# Altium footprint library Toroidal.PcbLib: 14 footprints
Each footprint in its own frame and in the unit in brackets; x right, y up, seen from the top. Pads: shape width x height; smd on the part's side, far side on the other; paste and mask are expansions set on the pad; w line width, h text height; cw(c..) or ccw(c..) is an arc to the next point about the centre after c.
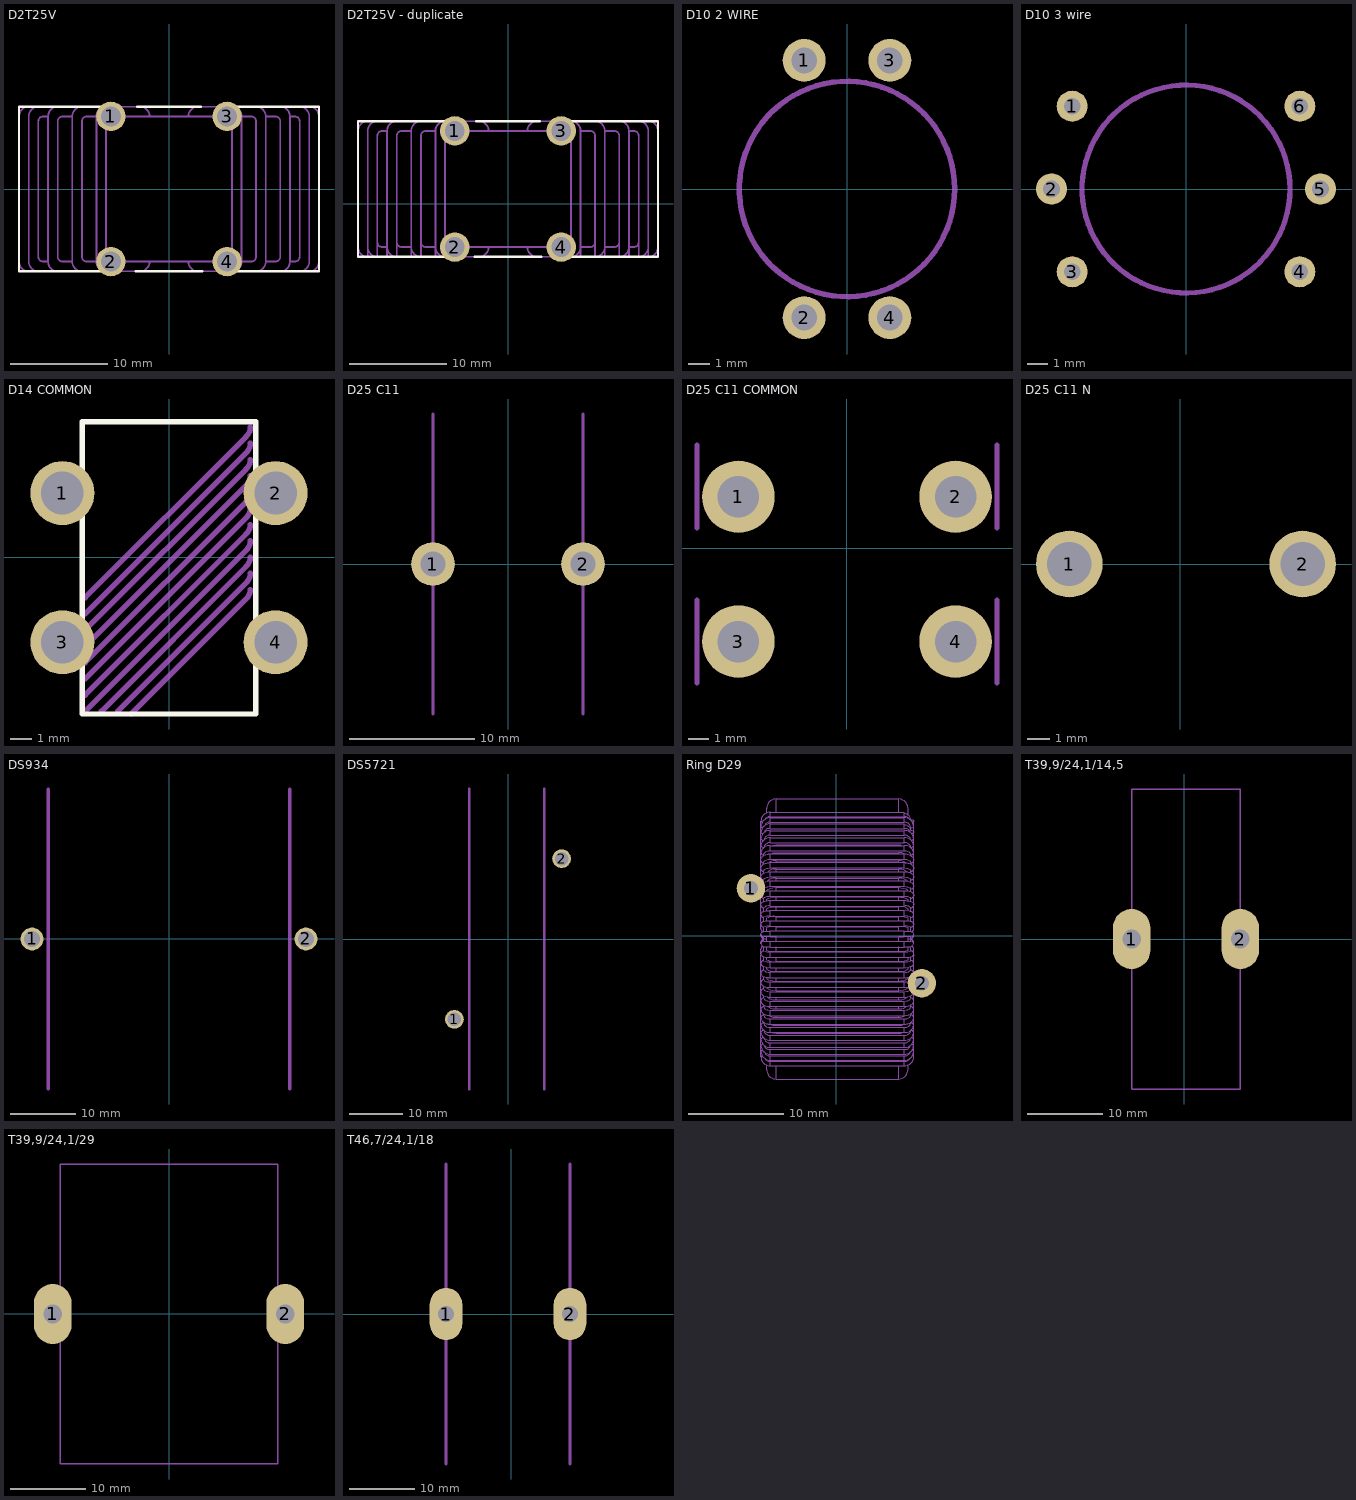
[diagram p0: the footprints below, top view; thin cyan lines are the x and y axes]

## D2T25V [mil]
pads (4):
  round 120 hole 80: 1(-236.22,295.28) 2(-236.22,-295.28) 3(236.22,295.28) 4(236.22,-295.28)
Top Overlay:
  lines w10: -259.84,-334.65 -610.24,-334.65 -610.24,334.65 -259.84,334.65 ; -135,-334.65 135,-334.65 ; -130,334.65 130,334.65 ; 259.84,-334.65 610.24,-334.65 610.24,334.65 259.84,334.65
Mechanical 3:
  text ".Designator / .Comment" at -85,-30 h40
Mechanical 13:
  lines w7.01: -590.55,-334.65 -118.11,-334.65 ccw(c-118.11,-295.28) -78.74,-295.28 ; -590.55,334.65 -118.11,334.65 cw(c-118.11,295.28) -78.74,295.28 ; -570.87,-334.65 cw(c-570.87,-295.28) -610.24,-295.28 -610.24,295.28 cw(c-570.87,295.28) -570.87,334.65 ; -531.5,-334.65 cw(c-531.5,-295.28) -570.87,-295.28 -570.87,295.28 cw(c-531.5,295.28) -531.5,334.65 ; -531.5,-279.53 -531.5,275.59 cw(c-511.81,275.59) -511.81,295.28 -492.13,295.28 ; -531.5,-275.59 ccw(c-511.81,-275.59) -511.81,-295.28 -492.13,-295.28 ; -452.76,-334.65 cw(c-452.76,-295.28) -492.13,-295.28 ; -452.76,334.65 ccw(c-452.76,295.28) -492.13,295.28 ; -354.33,-334.65 cw(c-354.33,-295.28) -393.7,-295.28 ; -354.33,275.59 cw(c-334.65,275.59) -334.65,295.28 -295.28,295.28 ; -354.33,279.53 -354.33,-275.59 ccw(c-334.65,-275.59) -334.65,-295.28 -295.28,-295.28 ; -354.33,334.65 ccw(c-354.33,295.28) -393.7,295.28 ; -255.91,-334.65 cw(c-255.91,-295.28) -295.28,-295.28 ; -255.91,334.65 ccw(c-255.91,295.28) -295.28,295.28 ; 78.74,-295.28 ccw(c118.11,-295.28) 118.11,-334.65 590.55,-334.65 ; 78.74,295.28 cw(c118.11,295.28) 118.11,334.65 590.55,334.65 ; 255.91,-334.65 ccw(c255.91,-295.28) 295.28,-295.28 ; 255.91,334.65 cw(c255.91,295.28) 295.28,295.28 ; 354.33,-334.65 ccw(c354.33,-295.28) 393.7,-295.28 ; 354.33,275.59 ccw(c334.65,275.59) 334.65,295.28 295.28,295.28 ; 354.33,279.53 354.33,-275.59 cw(c334.65,-275.59) 334.65,-295.28 295.28,-295.28 ; 354.33,334.65 cw(c354.33,295.28) 393.7,295.28 ; 452.76,-334.65 ccw(c452.76,-295.28) 492.13,-295.28 ; 452.76,334.65 cw(c452.76,295.28) 492.13,295.28 ; 531.5,-334.65 ccw(c531.5,-295.28) 570.87,-295.28 570.87,295.28 ccw(c531.5,295.28) 531.5,334.65 ; 531.5,-279.53 531.5,275.59 ccw(c511.81,275.59) 511.81,295.28 492.13,295.28 ; 531.5,-275.59 cw(c511.81,-275.59) 511.81,-295.28 492.13,-295.28 ; 570.87,-334.65 ccw(c570.87,-295.28) 610.24,-295.28 610.24,295.28 ccw(c570.87,295.28) 570.87,334.65 ; -492.13,-295.28 -492.13,295.28 ; -393.7,-295.28 -433.07,-295.28 cw(c-433.07,-275.59) -452.76,-275.59 -452.76,275.59 cw(c-433.07,275.59) -433.07,295.28 -393.7,295.28 ; -393.7,-295.28 -393.7,295.28 ; -295.28,-295.28 -295.28,295.28 ; 295.28,-295.28 295.28,295.28 ; 393.7,-295.28 393.7,295.28 ; 393.7,-295.28 433.07,-295.28 ccw(c433.07,-275.59) 452.76,-275.59 452.76,275.59 ccw(c433.07,275.59) 433.07,295.28 393.7,295.28 ; 492.13,-295.28 492.13,295.28 ; -255.91,-275.59 ccw(c-236.22,-275.59) -236.22,-295.28 236.22,-295.28 ccw(c236.22,-275.59) 255.91,-275.59 255.91,275.59 ccw(c236.22,275.59) 236.22,295.28 -236.22,295.28 ccw(c-236.22,275.59) -255.91,275.59 -255.91,-275.59
3D body "User Library-SCF20.step": height 1111.4, standoff -687.01, extent -530.84,-305.12 510.84,305.12

## D2T25V - duplicate [mil]
pads (4):
  round 120 hole 80: 1(-216.54,295.28) 2(-216.54,-177.17) 3(216.54,295.28) 4(216.54,-177.17)
Top Overlay:
  lines w10: -259.84,-216.54 -610.24,-216.54 -610.24,334.65 -259.84,334.65 ; -135,-216.54 135,-216.54 ; -130,334.65 130,334.65 ; 259.84,-216.54 610.24,-216.54 610.24,334.65 259.84,334.65
Mechanical 3:
  text ".Designator / .Comment" at -85,-30 h40
Mechanical 13:
  lines w7.01: -610.24,-216.54 -610.24,295.28 cw(c-570.87,295.28) -570.87,334.65 ; -610.24,-177.17 ccw(c-570.87,-177.17) -570.87,-216.54 -570.87,295.28 cw(c-531.5,295.28) -531.5,334.65 ; -590.55,-216.54 -118.11,-216.54 ccw(c-118.11,-177.17) -78.74,-177.17 ; -590.55,334.65 -118.11,334.65 cw(c-118.11,295.28) -78.74,295.28 ; -570.87,-177.17 ccw(c-531.5,-177.17) -531.5,-216.54 -531.5,275.59 cw(c-511.81,275.59) -511.81,295.28 -492.13,295.28 ; -531.5,-157.48 ccw(c-511.81,-157.48) -511.81,-177.17 -492.13,-177.17 ccw(c-452.76,-177.17) -452.76,-216.54 -452.76,275.59 cw(c-433.07,275.59) -433.07,295.28 -393.7,295.28 ; -492.13,-216.54 -492.13,295.28 ; -452.76,-157.48 ccw(c-433.07,-157.48) -433.07,-177.17 -393.7,-177.17 ccw(c-354.33,-177.17) -354.33,-216.54 -354.33,279.53 ; -452.76,334.65 ccw(c-452.76,295.28) -492.13,295.28 ; -393.7,-216.54 -393.7,295.28 ; -354.33,-157.48 ccw(c-334.65,-157.48) -334.65,-177.17 -295.28,-177.17 ccw(c-255.91,-177.17) -255.91,-216.54 -255.91,275.59 cw(c-236.22,275.59) -236.22,295.28 236.22,295.28 cw(c236.22,275.59) 255.91,275.59 255.91,-216.54 ccw(c255.91,-177.17) 295.28,-177.17 334.65,-177.17 ccw(c334.65,-157.48) 354.33,-157.48 ; -354.33,275.59 cw(c-334.65,275.59) -334.65,295.28 -295.28,295.28 ; -354.33,334.65 ccw(c-354.33,295.28) -393.7,295.28 ; -295.28,-216.54 -295.28,295.28 ; -255.91,-157.48 ccw(c-236.22,-157.48) -236.22,-177.17 236.22,-177.17 ccw(c236.22,-157.48) 255.91,-157.48 ; -255.91,334.65 ccw(c-255.91,295.28) -295.28,295.28 ; 78.74,-177.17 ccw(c118.11,-177.17) 118.11,-216.54 590.55,-216.54 ; 78.74,295.28 cw(c118.11,295.28) 118.11,334.65 590.55,334.65 ; 255.91,334.65 cw(c255.91,295.28) 295.28,295.28 ; 295.28,-216.54 295.28,295.28 ; 354.33,275.59 ccw(c334.65,275.59) 334.65,295.28 295.28,295.28 ; 354.33,279.53 354.33,-216.54 ccw(c354.33,-177.17) 393.7,-177.17 433.07,-177.17 ccw(c433.07,-157.48) 452.76,-157.48 ; 354.33,334.65 cw(c354.33,295.28) 393.7,295.28 ; 393.7,-216.54 393.7,295.28 ; 452.76,334.65 cw(c452.76,295.28) 492.13,295.28 ; 492.13,-216.54 492.13,295.28 ; 531.5,-157.48 cw(c511.81,-157.48) 511.81,-177.17 492.13,-177.17 cw(c452.76,-177.17) 452.76,-216.54 452.76,275.59 ccw(c433.07,275.59) 433.07,295.28 393.7,295.28 ; 531.5,334.65 cw(c531.5,295.28) 570.87,295.28 570.87,-216.54 ccw(c570.87,-177.17) 610.24,-177.17 ; 570.87,-177.17 cw(c531.5,-177.17) 531.5,-216.54 531.5,275.59 ccw(c511.81,275.59) 511.81,295.28 492.13,295.28 ; 570.87,334.65 cw(c570.87,295.28) 610.24,295.28 610.24,-196.85
3D body "44057.stp": height 1122.05, standoff 19.68, extent -551.17,-196.84 551.19,314.97

## D10 2 WIRE [mm]
pads (4):
  round 2 hole 1.2: 1(-2,6) 2(-2,-6) 3(2,6) 4(2,-6)
Mechanical 13:
  circle w0.254: c0,0 r5.025
3D body: height 4, standoff 0.5, extent 0,0 5.025,5
3D body: height 4, standoff 0.5, extent -5.025,0 0,5
3D body: height 4, standoff 0.5, extent 0,-5 5.025,0
3D body: height 4, standoff 0.5, extent -5.025,-5 0,0

## D10 3 wire [mm]
pads (6):
  round 1.5 hole 0.8: 1(-5.5,4) 2(-6.5,0) 3(-5.5,-4) 4(5.5,-4) 5(6.5,0) 6(5.5,4)
Mechanical 13:
  circle w0.254: c0,0 r5.025
3D body: height 4, standoff 0.5, extent -5.025,-5 0,0
3D body: height 4, standoff 0.5, extent 0,-5 5.025,0
3D body: height 4, standoff 0.5, extent -5.025,0 0,5
3D body: height 4, standoff 0.5, extent 0,0 5.025,5

## D14 COMMON [mm]
pads (4):
  round 3 hole 2: 1(-5,3) 2(5,3) 3(-5,-4) 4(5,-4)
Top Overlay:
  lines w0.254: -4.064,-7.366 4.064,-7.366 4.064,6.35 -4.064,6.35 -4.064,-7.366
Mechanical 1:
  lines w0.254: -3.937,-7.239 3.63,0.328 ccw(c3.197,0.762) 3.81,0.762 ; -3.937,-6.477 3.63,1.09 ccw(c3.197,1.524) 3.81,1.524 ; -3.937,-5.715 3.63,1.852 ccw(c3.197,2.286) 3.81,2.286 ; -3.937,-4.953 3.63,2.614 ccw(c3.197,3.048) 3.81,3.048 ; -3.937,-4.191 3.63,3.376 ccw(c3.197,3.81) 3.81,3.81 ; -3.937,-3.429 3.63,4.138 ccw(c3.197,4.572) 3.81,4.572 ; -3.937,-2.667 3.63,4.9 ccw(c3.197,5.334) 3.81,5.334 ; -3.937,-1.905 3.63,5.662 ccw(c3.197,6.096) 3.81,6.096 ; -3.175,-7.239 3.63,-0.434 ccw(c3.197,0) 3.81,0 ; -2.413,-7.239 3.63,-1.196 ccw(c3.197,-0.762) 3.81,-0.762 ; -1.778,-7.366 3.63,-1.958 ccw(c3.197,-1.524) 3.81,-1.524
3D body "User Library-coil_14x8.step": height 13.64, standoff -3.06, extent -4.635,-7.218 4.863,6.456

## D25 C11 [mm]
pads (2):
  round 3.5 hole 2: 1(-6,0) 2(6,0)
Mechanical 3:
  text ".Designator / .Comment" at -2.2,-0.7 h1
Mechanical 13:
  circle w0.254: c6,0 r1
  circle w0.254: c-6,0 r1
  lines w0.254: -6,-12 -6,-1 ; -6,1 -6,12 ; 6,-12 6,-1 ; 6,1 6,12
3D body "2101-v-rc.stp": height 27.45, standoff -6.15, extent -4.982,-10.452 5,10.452

## D25 C11 COMMON [mm]
pads (4):
  round 3.5 hole 2: 1(-5.25,2.5) 2(5.25,2.5) 3(-5.25,-4.5) 4(5.25,-4.5)
Mechanical 3:
  text ".Designator / .Comment" at -2.2,-0.7 h1
Mechanical 13:
  circle w0.254: c-5.25,-4.5 r1
  circle w0.254: c5.25,-4.5 r1
  circle w0.254: c5.25,2.5 r1
  circle w0.254: c-5.25,2.5 r1
  lines w0.254: -7.25,-6.5 -7.25,-2.5 ; -7.25,1 -7.25,5 ; 7.25,-6.5 7.25,-2.5 ; 7.25,1 7.25,5

## D25 C11 N [mm]
pads (2):
  round 3 hole 2: 1(-5,0) 2(5.5,0)
Mechanical 3:
  text ".Designator / .Comment" at -2.2,-0.7 h1
Mechanical 13:
  circle w0.254: c5.5,0 r1
  circle w0.254: c-5,0 r1

## DS934 [mm]
pads (2):
  round 3.5 hole 2.5: 1(-21,0) 2(21,0)
Mechanical 13:
  lines w0.5: -18.5,-23 -18.5,0 -18.5,23 ; 18.5,-23 18.5,0 18.5,23
3D body: height 46.5, standoff 23.5, extent -18,-23 0,0
3D body: height 46.5, standoff 23.5, extent -18,0 0,23
3D body: height 23.5, standoff 0.5, extent -18,0 0,23
3D body: height 23.5, standoff 0.5, extent -18,-23 0,0
3D body: height 23.5, standoff 0.5, extent 0,-23 18,0
3D body: height 23.5, standoff 0.5, extent 0,0 18,23
3D body: height 46.5, standoff 23.5, extent 0,0 18,23
3D body: height 46.5, standoff 23.5, extent 0,-23 18,0

## DS5721 [mm]
pads (2):
  round 3.5 hole 2.5: 1(-10,-15) 2(10,15)
Mechanical 13:
  lines w0.5: -7.25,-28 -7.25,28 ; 6.75,-28 6.75,0 6.75,28
3D body: height 58.5, standoff 29.5, extent -7.25,-29 6.75,0
3D body: height 29.5, standoff 0.5, extent -7.25,-29 6.75,0
3D body: height 29.5, standoff 0.5, extent -7.25,0 6.75,29
3D body: height 58.5, standoff 29.5, extent -7.25,0 6.75,29

## Ring D29 [mm]
pads (2):
  round 3 hole 1.5 unplated paste-25.4: 1(-9,5) 2(9,-5)
Mechanical 13:
  drawing of 1131 lines, arcs and shapes, not listed
3D body "User Library-D29_2x30.step": height 30.75, standoff 1.25, extent -8.1,-15.34 8,15.34

## T39,9/24,1/14,5 [mm]
pads (2):
  oval 5x8 hole 2.5 square: 1(-7,0) 2(7.5,0)
Mechanical 13:
  lines w0.2: -7,-20.001 7.5,-20.001 7.5,20.002 ; -7,-20 -7,20.002 ; -7,20.001 ccw(c-7,20.002) -7,20.002 ; -7,20.002 7.5,20.002 ; 7.5,20.002 ccw(c7.5,20.002) 7.5,20.001 ; 7.5,20.001 7.5,20.002
3D body: height 20, standoff -20, extent -7,-20.001 7.5,20.002

## T39,9/24,1/29 [mm]
pads (2):
  oval 5x8 hole 2.5 square: 1(-15.5,0) 2(15.5,0)
Mechanical 13:
  lines w0.2: -14.5,-20.002 0,-20.002 14.5,-20.002 14.5,20.001 0,20.001 ; -14.5,-20 -14.5,20.001 ; -14.5,20.001 ccw(c-14.5,20.001) -14.5,20.001 ; -14.5,20.001 0,20.001 ; 0,20.001 ccw(c0,20.001) 0,20.001 ; 0,20.001 0,20.001
3D body: height 40.5, standoff 0.5, extent 0,-20.002 14.5,20.001
3D body: height 40.5, standoff 0.5, extent -14.5,-20.002 0,20.001

## T46,7/24,1/18 [mm]
pads (2):
  oval 5x8 hole 2.5 square: 1(-10,0) 2(9,0)
Mechanical 13:
  lines w0.5: -10,-23 -10,0 -10,23 ; 9,-23 9,0 9,23
3D body: height 46.5, standoff 23.5, extent -9.5,-23 8.5,0
3D body: height 46.5, standoff 23.5, extent -9.5,0 8.5,23
3D body: height 23.5, standoff 0.5, extent -9.5,0 8.5,23
3D body: height 23.5, standoff 0.5, extent -9.5,-23 8.5,0